# Altium footprint library connector.PcbLib: 172 footprints (part 4 of 11)
Each footprint in its own frame and in the unit in brackets; x right, y up, seen from the top. Pads: shape width x height; smd on the part's side, far side on the other; paste and mask are expansions set on the pad; w line width, h text height; cw(c..) or ccw(c..) is an arc to the next point about the centre after c.
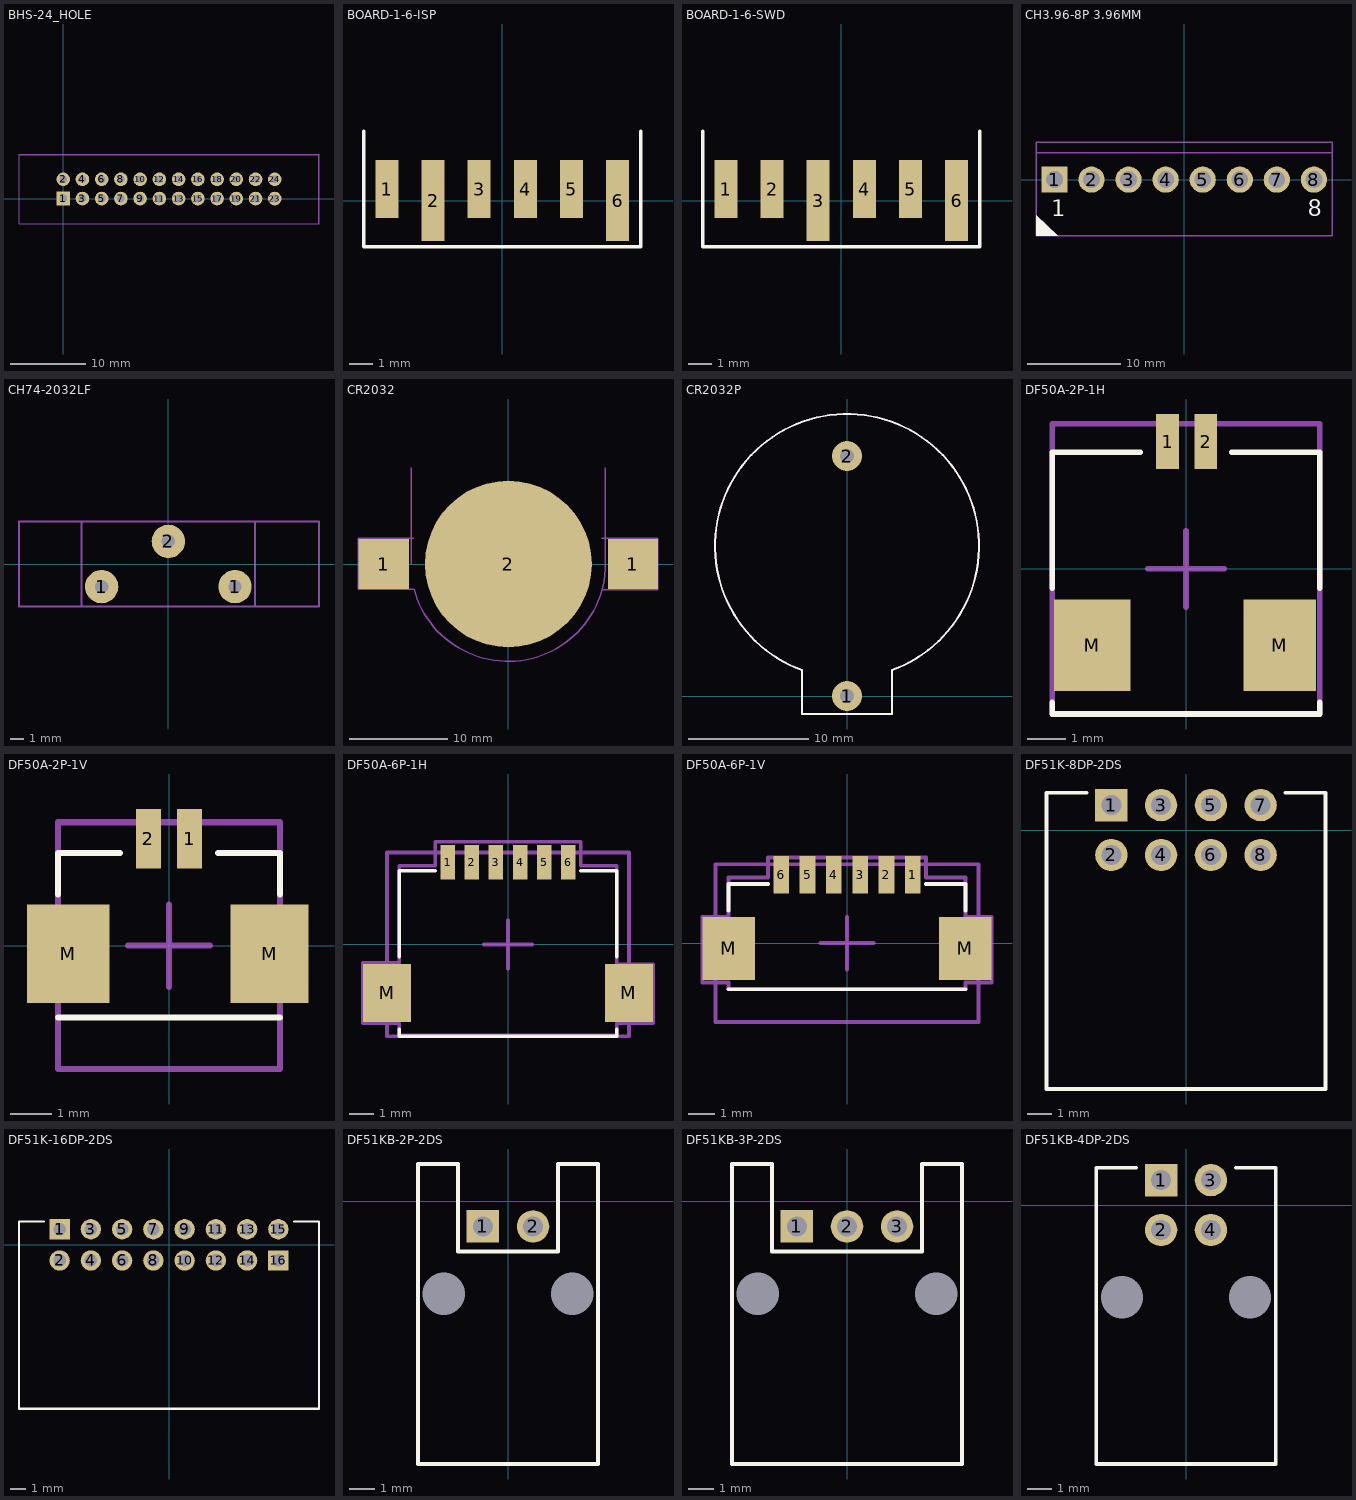
[diagram p3: the footprints below, top view; thin cyan lines are the x and y axes]

## BHS-24_HOLE [mm]
pads (24):
  rect 1.8x1.8 hole 1: 1(0,0)
  round 1.8 hole 1: 2(0,2.54) 3(2.54,0) 4(2.54,2.54) 5(5.08,0) 6(5.08,2.54) 7(7.62,0) 8(7.62,2.54) 9(10.16,0) 10(10.16,2.54) 11(12.7,0) 12(12.7,2.54) 13(15.24,0) 14(15.24,2.54) 15(17.78,0) 16(17.78,2.54) 17(20.32,0) 18(20.32,2.54) 19(22.86,0) 20(22.86,2.54) 21(25.4,0) 22(25.4,2.54) 23(27.94,0) 24(27.94,2.54)
Mechanical 29:
  circle w0.15: c0,0 r0.554
  lines w0.15: -5.842,-3.302 33.782,-3.302 33.782,5.842 -5.842,5.842 -5.842,-3.302 ; -5.8,-3.325 -5.8,5.8 33.725,5.8 33.725,-3.325 -5.8,-3.325
  text ".Designator" at 10.5,0.7 h1
3D body "IDC-24MS.STEP": height 9.1, standoff -3, extent -4.99,-3.275 33.09,6.325

## BOARD-1-6-ISP [mm]
pads (6):
  rect 1x2.5 smd: 1(-5,0.5) 3(-1,0.5) 4(1,0.5) 5(3,0.5)
  rect 1x3.5 smd: 2(-3,0) 6(5,0)
Top Overlay:
  lines w0.15: -6,3 -6,-2 6,-2 6,3

## BOARD-1-6-SWD [mm]
pads (6):
  rect 1x2.5 smd: 1(-5,0.5) 2(-3,0.5) 4(1,0.5) 5(3,0.5)
  rect 1x3.5 smd: 3(-1,0) 6(5,0)
Top Overlay:
  lines w0.15: -6,3 -6,-2 6,-2 6,3

## CH3.96-8P 3.96MM [mm]
height 22
pads (8):
  rect 2.8x2.8 hole 1.8: 1(-13.86,0)
  round 2.8 hole 1.8: 2(-9.9,0) 3(-5.94,0) 4(-1.98,0) 5(1.98,0) 6(5.94,0) 7(9.9,0) 8(13.86,0)
Top Overlay:
  region: -15.84,-3.825 -15.84,-6 -13.525,-6
  text "1" at -14.225,-4.5 h3
  text "8" at 13.225,-4.5 h3
Mechanical 29:
  region: -15.84,-3.825 -15.84,-6 -13.525,-6
  lines w0.15: -15.84,-6 -15.84,4 ; -15.84,-6 0,-6 ; -15.84,-6 -15.84,4 ; -15.84,-6 0,-6 ; -15.84,4 0,4 ; -15.84,4 0,4 ; 0,-6 15.84,-6 ; 0,-6 15.84,-6 ; 0,4 15.84,4 ; 0,4 15.84,4 ; 15.84,-6 15.84,4 ; 15.84,-6 15.84,4 ; -15.84,2.875 15.875,2.875 -15.84,2.875
  text ".Designator" at -4,-1.8 h1
3D body "CH3.96-8P 3.96MM.STEP": height 13.5, standoff -4, extent -15.84,-6 15.84,4

## CH74-2032LF [mm]
height 18.1
pads (3):
  round 2.5 hole 1: 1(-5,-1.7) 1(5,-1.7) 2(0,1.7)
Mechanical 29:
  lines w0.15: -6.5,-3.2 -6.5,3.2 ; -6.5,-3.2 6.5,-3.2 ; -6.5,-3.2 6.5,-3.2 ; -6.5,-3.2 -6.5,3.2 ; -6.5,-3.2 -11.2,-3.2 -11.2,3.2 -6.5,3.2 ; -6.5,3.2 6.5,3.2 ; -6.5,3.2 6.5,3.2 ; 6.5,-3.2 6.5,3.2 ; 6.5,-3.2 6.5,3.2 ; 6.5,-3.2 11.3,-3.2 11.3,0 11.3,3.2 6.5,3.2
  text ".Designator" at -3.5,-0.3 h1
3D body "User Library-Battery holder CR 2032.step": height 18.2, standoff -2.9, extent -11.224,-3.225 11.275,3.175

## CR2032 [mm]
pads (3):
  rect 5.1x5.1 smd: 1(-12.7,0) 1(12.7,0)
  round 17 smd paste-16: 2(0,0)
Mechanical 29:
  lines w0.15: -9.9,0 -9.9,9.8 ; -9.65,-2.575 -15.325,-2.575 -15.325,2.625 -9.625,2.625 ; -9.613,-2.557 ccw(c-0.025,0) 9.898,0 9.898,9.8 ; 9.525,2.6 15.225,2.6 15.225,-2.6 9.55,-2.6 9.55,-2.675
  text ".Designator" at -3.5,-0.3 h1
3D body "Battery CR2032.stp": height 3.17, standoff -0.01, extent -10.108,-10.008 9.908,10.008
3D body "battery_holder.stp": height 3.96, standoff 0, extent -15.334,-10.3 15.4,9.753

## CR2032P [mm] "Top and Side Loading Coin Cell Holders"
pads (2):
  round 2.5 hole 1.2: 1(0,0) 2(0,20)
Top Overlay:
  lines w0.15: -3.759,2.162 cw(c0,12.5) 3.759,2.162 ; -3.75,2.162 -3.75,-1.5 3.75,-1.5 3.75,2.162
Mechanical 29:
  lines w0.15: -3.759,1.162 -3.75,1.162 ; -3.759,2.162 cw(c0,12.5) 3.759,2.162 ; -3.759,2.165 -3.759,-1.5 3.741,-1.5 3.741,2.165 ; 3.75,1.162 3.759,1.162
  text ".Designator" at -3.5,11.7 h1
3D body "User Library-CR2032_HOR_HOLD.step": height 8.5, standoff -4, extent -11,-1 11,23.5

## DF50A-2P-1H [mm]
height 7.05
pads (4):
  rect 0.6x1.44 smd: 1(-0.482,3.334) 2(0.518,3.334)
  rect 2x2.4 smd: M(-2.45,-2)
  rect 1.9x2.4 smd: M(2.45,-2)
Top Overlay:
  lines w0.15: -3.5,-3.5 -3.5,-3.8 3.5,-3.8 3.5,-3.5 ; -3.5,-0.5 -3.5,3.05 -1.2,3.05 ; 1.2,3.05 3.5,3.05 3.5,-0.5
  text "." at -1.5,3.5 h0.1
Mechanical 15:
  lines w0.15: -1,0 0,0 ; 0,-1 0,0 ; 0,1 0,0 ; 1,0 0,0 ; -3.5,-3.8 -3.5,3.8 3.5,3.8 3.5,-3.8 -3.5,-3.8
3D body "DF50A-2P-1H.stp": height 6.11, standoff 0.04, extent -3.355,-3.85 3.455,3.75

## DF50A-2P-1V [mm]
height 7.05
pads (4):
  rect 0.6x1.44 smd: 1(0.5,2.6) 2(-0.5,2.6)
  rect 2x2.4 smd: M(-2.45,-0.2)
  rect 1.9x2.4 smd: M(2.45,-0.2)
Top Overlay:
  lines w0.15: -2.7,-1.75 0,-1.75 2.7,-1.75 ; -2.7,1.25 -2.7,2.25 -1.2,2.25 ; 1.2,2.25 2.7,2.25 2.7,1.25
  text "." at 1.5,2.925 h0.1
Mechanical 15:
  lines w0.15: -1,0 0,0 ; 0,-1 0,0 ; 0,1 0,0 ; 1,0 0,0 ; -2.7,-3 2.7,-3 2.7,3 -2.7,3 -2.7,-3
3D body "DF50A-2P-1V(51).stp": height 7.06, standoff 0.01, extent -2.65,-2.76 2.6,2.91

## DF50A-6P-1H [mm]
height 7.05
pads (8):
  rect 0.6x1.44 smd: 1(-2.5,3.4) 2(-1.5,3.4) 3(-0.5,3.4) 4(0.5,3.4) 5(1.5,3.4) 6(2.5,3.4)
  rect 2x2.4 smd: M(-5,-2) M(5,-2)
Top Overlay:
  lines w0.15: -4.5,-3.5 -4.5,-3.8 4.5,-3.8 4.5,-3.5 ; -4.5,-0.5 -4.5,3.05 -3,3.05 ; 3,3.05 4.5,3.05 4.5,-0.5
  text "." at -3.5,3.5 h0.1
Top Courtyard:
  lines w0.15: -6,-3.25 -4.5,-3.25 -4.5,-3.75 2,-3.75 4.5,-3.75 4.5,-3.25 6,-3.25 6,-0.828 4.5,-0.828 4.5,3.25 3,3.25 3,4.25 1,4.25 -3,4.25 -3,3.25 -4.5,3.25 -4.5,-0.75 -6,-0.75 -6,-3.25
Mechanical 15:
  lines w0.15: -1,0 0,0 ; 0,-1 0,0 ; 0,1 0,0 ; 1,0 0,0 ; -5,-3.8 -5,3.8 5,3.8 5,-3.8 -5,-3.8
3D body "DF50A-6P-1H.stp": height 6.07, standoff -0.01, extent -5.405,-3.8 5.405,3.8

## DF50A-6P-1V [mm]
height 7.05
pads (9):
  rect 0.6x1.44 smd: 1(2.5,2.6) 1(2.5,2.6) 2(1.5,2.6) 3(0.5,2.6) 4(-0.5,2.6) 5(-1.5,2.6) 6(-2.5,2.6)
  rect 2x2.4 smd: M(-4.5,-0.2) M(4.5,-0.2)
Top Overlay:
  lines w0.15: -4.5,-1.75 0,-1.75 4.5,-1.75 ; -4.5,1.25 -4.5,2.25 -3,2.25 ; 3,2.25 4.5,2.25 4.5,1.25
  text "." at 3.475,2.9 h0.1
Top Courtyard:
  lines w0.15: -5.5,-1.5 -5.5,1 -4.5,1 -4.5,2.5 -3,2.5 -3,3.25 0,3.25 3,3.25 3,2.5 4.5,2.5 4.5,1 5.5,1 5.5,-1.5 4.5,-1.5 4.5,-1.75 0,-1.75 -4.5,-1.75 -4.5,-1.5 -5.5,-1.5
Mechanical 15:
  lines w0.15: -1,0 0,0 ; 0,-1 0,0 ; 0,1 0,0 ; 1,0 0,0 ; -5,-3 5,-3 5,3 -5,3 -5,-3
3D body "DF50A-6P-1V(51).stp": height 7.06, standoff 0.01, extent -4.625,-2.8 4.625,2.87

## DF51K-8DP-2DS [mm]
pads (8):
  rect 1.3x1.3 hole 0.8: 1(-3,1)
  round 1.3 hole 0.8: 2(-3,-1) 3(-1,1) 4(-1,-1) 5(1,1) 6(1,-1) 7(3,1) 8(3,-1)
Top Overlay:
  lines w0.15: -4,1.5 -5.6,1.5 -5.6,-10.4 5.6,-10.4 5.6,1.5 4,1.5
3D body "DF51K-8DP-2DS_4800594000_3D_stp.stp": height 8.78, standoff -2.97, extent -5.6,-10.377 5.6,1.523

## DF51K-16DP-2DS [mm]
pads (16):
  rect 1.3x1.3 hole 0.8: 1(-7,1) 16(7,-1)
  round 1.3 hole 0.8: 2(-7,-1) 3(-5,1) 4(-5,-1) 5(-3,1) 6(-3,-1) 7(-1,1) 8(-1,-1) 9(1,1) 10(1,-1) 11(3,1) 12(3,-1) 13(5,1) 14(5,-1) 15(7,1)
Top Overlay:
  lines w0.15: -8,1.5 -9.6,1.5 -9.6,-10.5 1.6,-10.5 ; -1.6,-10.5 9.6,-10.5 9.6,1.5 8,1.5
3D body "DF51K-16DP-2DS_4800598000_3D_stp.stp": height 9.03, standoff -2.72, extent -9.601,-10.535 9.599,1.365

## DF51KB-2P-2DS [mm]
pads (4):
  rect 1.3x1.3 hole 0.8: 1(-1,-1)
  round 1.3 hole 0.8: 2(1,-1)
  round 0 hole 1.7 unplated: 5(-2.57,-3.7) 6(2.57,-3.7)
Top Overlay:
  lines w0.15: -3.6,-10.5 3.6,-10.5 3.6,1.5 2,1.5 2,-2 -2,-2 -2,1.5 -3.6,1.5 -3.6,-10.5
3D body "DF51KB-2P-2DS_4800587000_3D_stp.stp": height 6.47, standoff -2.83, extent -3.599,-10.533 3.601,1.517

## DF51KB-3P-2DS [mm]
pads (5):
  rect 1.3x1.3 hole 0.8: 1(-2,-1)
  round 1.3 hole 0.8: 2(0,-1) 3(2,-1)
  round 0 hole 1.7 unplated: 5(-3.57,-3.7) 6(3.57,-3.7)
Top Overlay:
  lines w0.15: -4.6,-10.5 -4.6,1.5 -3,1.5 -3,-2 3,-2 3,1.5 4.6,1.5 4.6,-10.5 -4.6,-10.5
3D body "DF51KB-3P-2DS_4800588000_3D_stp.stp": height 6.41, standoff -2.89, extent -4.609,-10.46 4.591,1.59

## DF51KB-4DP-2DS [mm]
pads (6):
  rect 1.3x1.3 hole 0.8: 1(-1,1)
  round 1.3 hole 0.8: 2(-1,-1) 3(1,1) 4(1,-1)
  round 0 hole 1.7 unplated: 5(-2.57,-3.7) 6(2.57,-3.7)
Top Overlay:
  lines w0.15: -2,1.5 -3.6,1.5 -3.6,-10.4 3.6,-10.4 3.6,1.5 2,1.5
3D body "DF51KB-4DP-2DS_4800592000_3D_stp.stp": height 8.78, standoff -2.97, extent -3.6,-10.384 3.6,1.516